# Altium footprint library MCUs.PcbLib: 22 footprints (part 1 of 2)
Each footprint in its own frame and in the unit in brackets; x right, y up, seen from the top. Pads: shape width x height; smd on the part's side, far side on the other; paste and mask are expansions set on the pad; w line width, h text height; cw(c..) or ccw(c..) is an arc to the next point about the centre after c.
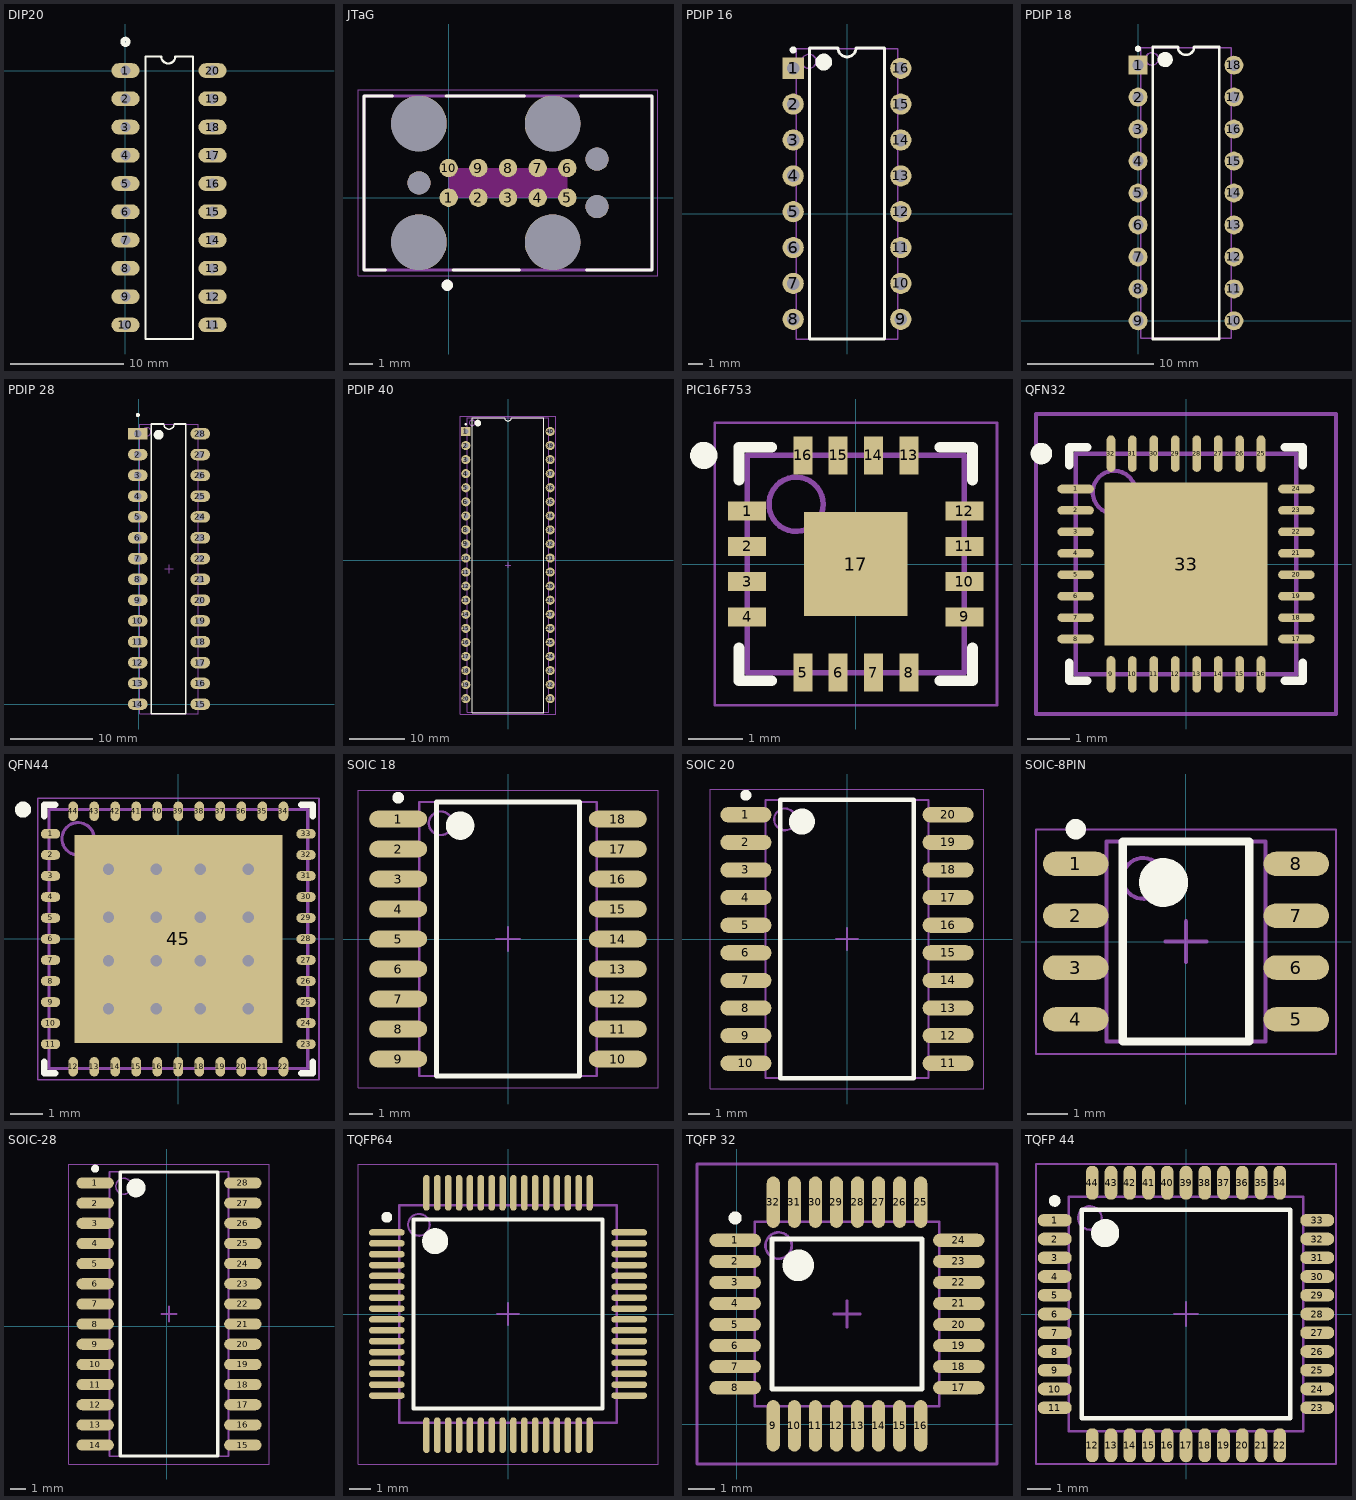
[diagram p0: the footprints below, top view; thin cyan lines are the x and y axes]

## DIP20 [mm] "PDIP 20"
pads (20):
  oval 2.5x1.3 hole 0.9: 1(0,0) 2(0,-2.5) 3(0,-5) 4(0,-7.5) 5(0,-10) 6(0,-12.5) 7(0,-15) 8(0,-17.5) 9(0,-20) 10(0,-22.5) 11(7.707,-22.5) 12(7.707,-20) 13(7.707,-17.5) 14(7.707,-15) 15(7.707,-12.5) 16(7.707,-10) 17(7.707,-7.5) 18(7.707,-5) 19(7.707,-2.5) 20(7.707,0)
Top Overlay:
  circle w0.4: c0,2.54 r0.25
  lines w0.2: 1.778,-23.75 1.778,1.25 3.165,1.25 ccw(c3.79,1.25) 4.415,1.25 5.969,1.25 5.969,-23.75 1.778,-23.75
3D body "User Library-DIP20.STEP": height 5.07, standoff -3.31, extent -0.1,-24.446 7.72,2.094

## JTaG [mil] "Connector Debugger"
pads (17):
  round 31 smd paste-39.37: 1(0,0) 2(50,0) 3(100,0) 4(150,0) 5(200,0) 6(200,50) 7(150,50) 8(100,50) 9(50,50) 10(0,50)
  round 93.5 hole 93.5 unplated: ""(-50,-75) ""(-50,125) ""(175,-75) ""(175,125)
  round 39 hole 39 unplated: ""(-50,25) ""(250,-14.96) ""(250,64.96)
Top Overlay:
  circle w9.45: c-2.36,-147.49 r4.72
  lines w5: -106.69,-121.77 -142.91,-121.77 -142.91,171.77 -94.88,171.77 ; -4.33,171.77 127.56,171.77 ; 7.48,-121.77 119.69,-121.77 ; 222.05,171.77 342.91,171.77 342.91,-121.77 231.89,-121.77
Keep-Out Layer:
  drawing of 18 lines, arcs and shapes, not listed
Mechanical 13:
  circle w9.45: c-2.16,-147.49 r4.72
  lines w5: -142.91,-121.77 342.91,-121.77 342.91,171.77 -142.91,171.77 -142.91,-121.77
Mechanical 15:
  lines w1.97: -152.76,-131.61 352.76,-131.61 352.76,181.61 -152.76,181.61 -152.76,-131.61

## PDIP 16 [mm] "PDIP 16 2.54mm Pitch"
pads (16):
  rect 1.5x1.5 hole 0.9: 1(-3.81,10.287)
  round 1.5 hole 0.9: 2(-3.81,7.747) 3(-3.81,5.207) 4(-3.81,2.667) 5(-3.81,0.127) 6(-3.81,-2.413) 7(-3.81,-4.953) 8(-3.81,-7.493) 9(3.81,-7.493) 10(3.81,-4.953) 11(3.81,-2.413) 12(3.81,0.127) 13(3.81,2.667) 14(3.81,5.207) 15(3.81,7.747) 16(3.81,10.287)
Top Overlay:
  circle w0.6: c-1.65,10.727 r0.3
  circle w0.25: c-3.81,11.587 r0.125
  lines w0.2: -2.65,-8.89 2.65,-8.89 2.65,11.727 0.635,11.727 cw(c0,11.727) -0.635,11.727 -2.65,11.727 -2.65,-8.89
Mechanical 13:
  circle w0.1: c-2.7,10.777 r0.5
  lines w0.1: -3.6,-8.89 3.6,-8.89 3.6,11.677 -3.6,11.677 -3.6,-8.89
3D body "DIP16.step": height 8.89, standoff 2.13, extent -4.064,-9.398 3.81,12.192
3D body "Socket IC 16P.step": height 5.5, standoff -2.5, extent -5.08,-8.763 5.08,11.557

## PDIP 18 [mm] "IC PDIP 18"
pads (18):
  rect 1.5x1.5 hole 0.9: 1(0,20.32)
  round 1.5 hole 0.9: 2(0,17.78) 3(0,15.24) 4(0,12.7) 5(0,10.16) 6(0,7.62) 7(0,5.08) 8(0,2.54) 9(0,0) 10(7.62,0) 11(7.62,2.54) 12(7.62,5.08) 13(7.62,7.62) 14(7.62,10.16) 15(7.62,12.7) 16(7.62,15.24) 17(7.62,17.78) 18(7.62,20.32)
Top Overlay:
  circle w0.6: c2.16,20.76 r0.3
  circle w0.25: c0,21.62 r0.125
  lines w0.2: 1.16,-1.44 6.46,-1.44 6.46,21.76 4.445,21.76 cw(c3.81,21.76) 3.175,21.76 1.16,21.76 1.16,-1.44
Mechanical 13:
  circle w0.1: c1.11,20.81 r0.5
  lines w0.1: 0.21,-1.39 7.41,-1.39 7.41,21.71 0.21,21.71 0.21,-1.39
3D body "DIP18-1.STEP": height 5.57, standoff -2.81, extent -0.227,-1.333 7.593,21.907

## PDIP 28 [mm] "PDIP 28 Through Hole"
pads (28):
  rect 2.4x1.4 hole 0.9: 1(-0.127,33.02)
  oval 2.4x1.4 hole 0.9: 2(-0.127,30.48) 3(-0.127,27.94) 4(-0.127,25.4) 5(-0.127,22.86) 6(-0.127,20.32) 7(-0.127,17.78) 8(-0.127,15.24) 9(-0.127,12.7) 10(-0.127,10.16) 11(-0.127,7.62) 12(-0.127,5.08) 13(-0.127,2.54) 14(-0.127,0) 15(7.493,0) 16(7.493,2.54) 17(7.493,5.08) 18(7.493,7.62) 19(7.493,10.16) 20(7.493,12.7) 21(7.493,15.24) 22(7.493,17.78) 23(7.493,20.32) 24(7.493,22.86) 25(7.493,25.4) 26(7.493,27.94) 27(7.493,30.48) 28(7.493,33.02)
Top Overlay:
  circle w0.6: c2.413,32.893 r0.3
  circle w0.25: c-0.127,35.306 r0.125
  lines w0.2: 1.524,-1.19 5.715,-1.19 5.715,34.21 4.318,34.21 cw(c3.683,34.21) 3.048,34.21 1.524,34.21 1.524,-1.19
Mechanical 13:
  circle w0.1: c0.983,33.26 r0.5
  lines w0.1: 0.083,-1.14 7.283,-1.14 7.283,34.16 0.083,34.16 0.083,-1.14
Mechanical 15:
  lines w0.1: 3.183,16.51 4.183,16.51 ; 3.683,16.01 3.683,17.01
3D body "IC SOCKET 28P.step": height 5.3, standoff -2.7, extent -1.397,-1.143 8.763,34.417
3D body "28PDIP.step": height 9.15, standoff 2.93, extent -0.254,-1.461 7.62,34.481

## PDIP 40 [mm] "PDIP 40 IC Socket"
pads (40):
  rect 1.65x1.65 hole 0.9: 1(-7.62,23.241)
  round 1.65 hole 0.9: 2(-7.62,20.701) 3(-7.62,18.161) 4(-7.62,15.621) 5(-7.62,13.081) 6(-7.62,10.541) 7(-7.62,8.001) 8(-7.62,5.461) 9(-7.62,2.921) 10(-7.62,0.381) 11(-7.62,-2.159) 12(-7.62,-4.699) 13(-7.62,-7.239) 14(-7.62,-9.779) 15(-7.62,-12.319) 16(-7.62,-14.859) 17(-7.62,-17.399) 18(-7.62,-19.939) 19(-7.62,-22.479) 20(-7.62,-25.019) 21(7.62,-25.019) 22(7.62,-22.479) 23(7.62,-19.939) 24(7.62,-17.399) 25(7.62,-14.859) 26(7.62,-12.319) 27(7.62,-9.779) 28(7.62,-7.239) 29(7.62,-4.699) 30(7.62,-2.159) 31(7.62,0.381) 32(7.62,2.921) 33(7.62,5.461) 34(7.62,8.001) 35(7.62,10.541) 36(7.62,13.081) 37(7.62,15.621) 38(7.62,18.161) 39(7.62,20.701) 40(7.62,23.241)
Top Overlay:
  circle w0.6: c-5.45,24.761 r0.3
  circle w0.25: c-7.62,24.541 r0.125
  lines w0.2: -6.45,-27.539 6.45,-27.539 6.45,25.761 0.635,25.761 cw(c0,25.761) -0.635,25.761 -6.45,25.761 -6.45,-27.539
Mechanical 13:
  circle w0.1: c-6.475,24.811 r0.5
  lines w0.1: -7.375,-27.489 7.375,-27.489 7.375,25.711 -7.375,25.711 -7.375,-27.489
Mechanical 15:
  lines w0.05: -8.65,-27.789 8.65,-27.789 8.65,26.011 -8.65,26.011 -8.65,-27.789
  lines w0.1: -0.5,-0.889 0.5,-0.889 ; 0,-1.389 0,-0.389
3D body "40 PDIP SOCKET.STEP": height 4.47, standoff -2.9, extent -8.85,-26.289 8.85,24.511
3D body: height 0, standoff -1.6, extent 7.485,22.881 7.755,23.601
3D body: height 3.51, standoff 3.23, extent 7.375,22.741 7.755,23.741
3D body: height 3.24, standoff 0, extent 7.485,22.741 7.755,23.741
3D body: height 0, standoff -1.6, extent 7.485,20.341 7.755,21.061
3D body: height 3.51, standoff 3.23, extent 7.375,20.201 7.755,21.201
3D body: height 3.24, standoff 0, extent 7.485,20.201 7.755,21.201
3D body: height 0, standoff -1.6, extent 7.485,17.801 7.755,18.521
3D body: height 3.51, standoff 3.23, extent 7.375,17.661 7.755,18.661
3D body: height 3.24, standoff 0, extent 7.485,17.661 7.755,18.661
3D body: height 0, standoff -1.6, extent 7.485,15.261 7.755,15.981
3D body: height 3.51, standoff 3.23, extent 7.375,15.121 7.755,16.121
3D body: height 3.24, standoff 0, extent 7.485,15.121 7.755,16.121
3D body: height 0, standoff -1.6, extent 7.485,12.721 7.755,13.441
3D body: height 3.51, standoff 3.23, extent 7.375,12.581 7.755,13.581
3D body: height 3.24, standoff 0, extent 7.485,12.581 7.755,13.581
3D body: height 0, standoff -1.6, extent 7.485,10.181 7.755,10.901
3D body: height 3.51, standoff 3.23, extent 7.375,10.041 7.755,11.041
3D body: height 3.24, standoff 0, extent 7.485,10.041 7.755,11.041
3D body: height 0, standoff -1.6, extent 7.485,7.641 7.755,8.361
3D body: height 3.51, standoff 3.23, extent 7.375,7.501 7.755,8.501
3D body: height 3.24, standoff 0, extent 7.485,7.501 7.755,8.501
3D body: height 0, standoff -1.6, extent 7.485,5.101 7.755,5.821
3D body: height 3.51, standoff 3.23, extent 7.375,4.961 7.755,5.961
3D body: height 3.24, standoff 0, extent 7.485,4.961 7.755,5.961
3D body: height 0, standoff -1.6, extent 7.485,2.561 7.755,3.281
3D body: height 3.51, standoff 3.23, extent 7.375,2.421 7.755,3.421
3D body: height 3.24, standoff 0, extent 7.485,2.421 7.755,3.421
3D body: height 0, standoff -1.6, extent 7.485,0.021 7.755,0.741
3D body: height 3.51, standoff 3.23, extent 7.375,-0.119 7.755,0.881
3D body: height 3.24, standoff 0, extent 7.485,-0.119 7.755,0.881
3D body: height 0, standoff -1.6, extent 7.485,-2.519 7.755,-1.799
3D body: height 3.51, standoff 3.23, extent 7.375,-2.659 7.755,-1.659
3D body: height 3.24, standoff 0, extent 7.485,-2.659 7.755,-1.659
3D body: height 0, standoff -1.6, extent 7.485,-5.059 7.755,-4.339
3D body: height 3.51, standoff 3.23, extent 7.375,-5.199 7.755,-4.199
3D body: height 3.24, standoff 0, extent 7.485,-5.199 7.755,-4.199
3D body: height 0, standoff -1.6, extent 7.485,-7.599 7.755,-6.879
3D body: height 3.51, standoff 3.23, extent 7.375,-7.739 7.755,-6.739
3D body: height 3.24, standoff 0, extent 7.485,-7.739 7.755,-6.739
3D body: height 0, standoff -1.6, extent 7.485,-10.139 7.755,-9.419
3D body: height 3.51, standoff 3.23, extent 7.375,-10.279 7.755,-9.279
3D body: height 3.24, standoff 0, extent 7.485,-10.279 7.755,-9.279
3D body: height 0, standoff -1.6, extent 7.485,-12.679 7.755,-11.959
3D body: height 3.51, standoff 3.23, extent 7.375,-12.819 7.755,-11.819
3D body: height 3.24, standoff 0, extent 7.485,-12.819 7.755,-11.819
3D body: height 0, standoff -1.6, extent 7.485,-15.219 7.755,-14.499
3D body: height 3.51, standoff 3.23, extent 7.375,-15.359 7.755,-14.359
3D body: height 3.24, standoff 0, extent 7.485,-15.359 7.755,-14.359
3D body: height 0, standoff -1.6, extent 7.485,-17.759 7.755,-17.039
3D body: height 3.51, standoff 3.23, extent 7.375,-17.899 7.755,-16.899
3D body: height 3.24, standoff 0, extent 7.485,-17.899 7.755,-16.899
3D body: height 0, standoff -1.6, extent 7.485,-20.299 7.755,-19.579
3D body: height 3.51, standoff 3.23, extent 7.375,-20.439 7.755,-19.439
3D body: height 3.24, standoff 0, extent 7.485,-20.439 7.755,-19.439
3D body: height 0, standoff -1.6, extent 7.485,-22.839 7.755,-22.119
3D body: height 3.51, standoff 3.23, extent 7.375,-22.979 7.755,-21.979
3D body: height 3.24, standoff 0, extent 7.485,-22.979 7.755,-21.979
3D body: height 0, standoff -1.6, extent 7.485,-25.379 7.755,-24.659
3D body: height 3.51, standoff 3.23, extent 7.375,-25.519 7.755,-24.519
3D body: height 3.24, standoff 0, extent 7.485,-25.519 7.755,-24.519
3D body: height 0, standoff -1.6, extent -7.755,-25.379 -7.485,-24.659
3D body: height 3.51, standoff 3.23, extent -7.755,-25.519 -7.375,-24.519
3D body: height 3.24, standoff 0, extent -7.755,-25.519 -7.485,-24.519
3D body: height 0, standoff -1.6, extent -7.755,-22.839 -7.485,-22.119
3D body: height 3.51, standoff 3.23, extent -7.755,-22.979 -7.375,-21.979
3D body: height 3.24, standoff 0, extent -7.755,-22.979 -7.485,-21.979
3D body: height 0, standoff -1.6, extent -7.755,-20.299 -7.485,-19.579
3D body: height 3.51, standoff 3.23, extent -7.755,-20.439 -7.375,-19.439
3D body: height 3.24, standoff 0, extent -7.755,-20.439 -7.485,-19.439
3D body: height 0, standoff -1.6, extent -7.755,-17.759 -7.485,-17.039
3D body: height 3.51, standoff 3.23, extent -7.755,-17.899 -7.375,-16.899
3D body: height 3.24, standoff 0, extent -7.755,-17.899 -7.485,-16.899
3D body: height 0, standoff -1.6, extent -7.755,-15.219 -7.485,-14.499
3D body: height 3.51, standoff 3.23, extent -7.755,-15.359 -7.375,-14.359
3D body: height 3.24, standoff 0, extent -7.755,-15.359 -7.485,-14.359
3D body: height 0, standoff -1.6, extent -7.755,-12.679 -7.485,-11.959
3D body: height 3.51, standoff 3.23, extent -7.755,-12.819 -7.375,-11.819
3D body: height 3.24, standoff 0, extent -7.755,-12.819 -7.485,-11.819
3D body: height 0, standoff -1.6, extent -7.755,-10.139 -7.485,-9.419
3D body: height 3.51, standoff 3.23, extent -7.755,-10.279 -7.375,-9.279
3D body: height 3.24, standoff 0, extent -7.755,-10.279 -7.485,-9.279
3D body: height 0, standoff -1.6, extent -7.755,-7.599 -7.485,-6.879
3D body: height 3.51, standoff 3.23, extent -7.755,-7.739 -7.375,-6.739
3D body: height 3.24, standoff 0, extent -7.755,-7.739 -7.485,-6.739
3D body: height 0, standoff -1.6, extent -7.755,-5.059 -7.485,-4.339
3D body: height 3.51, standoff 3.23, extent -7.755,-5.199 -7.375,-4.199
3D body: height 3.24, standoff 0, extent -7.755,-5.199 -7.485,-4.199
3D body: height 0, standoff -1.6, extent -7.755,-2.519 -7.485,-1.799
3D body: height 3.51, standoff 3.23, extent -7.755,-2.659 -7.375,-1.659
3D body: height 3.24, standoff 0, extent -7.755,-2.659 -7.485,-1.659
3D body: height 0, standoff -1.6, extent -7.755,0.021 -7.485,0.741
3D body: height 3.51, standoff 3.23, extent -7.755,-0.119 -7.375,0.881
3D body: height 3.24, standoff 0, extent -7.755,-0.119 -7.485,0.881
3D body: height 0, standoff -1.6, extent -7.755,2.561 -7.485,3.281
3D body: height 3.51, standoff 3.23, extent -7.755,2.421 -7.375,3.421
3D body: height 3.24, standoff 0, extent -7.755,2.421 -7.485,3.421
3D body: height 0, standoff -1.6, extent -7.755,5.101 -7.485,5.821
3D body: height 3.51, standoff 3.23, extent -7.755,4.961 -7.375,5.961
3D body: height 3.24, standoff 0, extent -7.755,4.961 -7.485,5.961
3D body: height 0, standoff -1.6, extent -7.755,7.641 -7.485,8.361
3D body: height 3.51, standoff 3.23, extent -7.755,7.501 -7.375,8.501
3D body: height 3.24, standoff 0, extent -7.755,7.501 -7.485,8.501
3D body: height 0, standoff -1.6, extent -7.755,10.181 -7.485,10.901
3D body: height 3.51, standoff 3.23, extent -7.755,10.041 -7.375,11.041
3D body: height 3.24, standoff 0, extent -7.755,10.041 -7.485,11.041
3D body: height 0, standoff -1.6, extent -7.755,12.721 -7.485,13.441
3D body: height 3.51, standoff 3.23, extent -7.755,12.581 -7.375,13.581
3D body: height 3.24, standoff 0, extent -7.755,12.581 -7.485,13.581
3D body: height 0, standoff -1.6, extent -7.755,15.261 -7.485,15.981
3D body: height 3.51, standoff 3.23, extent -7.755,15.121 -7.375,16.121
3D body: height 3.24, standoff 0, extent -7.755,15.121 -7.485,16.121
3D body: height 0, standoff -1.6, extent -7.755,17.801 -7.485,18.521
3D body: height 3.51, standoff 3.23, extent -7.755,17.661 -7.375,18.661
3D body: height 3.24, standoff 0, extent -7.755,17.661 -7.485,18.661
3D body: height 0, standoff -1.6, extent -7.755,20.341 -7.485,21.061
3D body: height 3.51, standoff 3.23, extent -7.755,20.201 -7.375,21.201
3D body: height 3.24, standoff 0, extent -7.755,20.201 -7.485,21.201
3D body: height 0, standoff -1.6, extent -7.755,22.881 -7.485,23.601
3D body: height 3.51, standoff 3.23, extent -7.755,22.741 -7.375,23.741
3D body: height 3.24, standoff 0, extent -7.755,22.741 -7.485,23.741
3D body "PDIP-40.step": height 8.96, standoff 1.6, extent -7.765,-27.051 7.765,25.209

## PIC16F753 [mm] "QFN 16P"
height 1
pads (17):
  rect 0.7x0.35 smd: 1(-2,0.975) 2(-2,0.325) 3(-2,-0.325) 4(-2,-0.975) 9(2,-0.975) 10(2,-0.325) 11(2,0.325) 12(2,0.975)
  rect 0.35x0.7 smd: 5(-0.975,-2) 6(-0.325,-2) 7(0.325,-2) 8(0.975,-2) 13(0.975,2) 14(0.325,2) 15(-0.325,2) 16(-0.975,2)
  rect 1.91x1.91 smd: 17(0,0)
Top Overlay:
  circle w0.25: c-2.8,2 r0.125
  lines w0.2: -2.15,-1.55 -2.15,-2.15 -1.55,-2.15 ; -2.15,1.55 -2.15,2.15 -1.55,2.15 ; 1.55,-2.15 2.15,-2.15 2.15,-1.55 ; 1.55,2.15 2.15,2.15 2.15,1.55
Mechanical 13:
  circle w0.1: c-1.1,1.1 r0.5
  lines w0.1: -2,-2 2,-2 2,2 -2,2 -2,-2
Mechanical 15:
  lines w0.05: -2.6,-2.6 2.6,-2.6 2.6,2.6 -2.6,2.6 -2.6,-2.6
  lines w0.1: -0.5,0 0.5,0 ; 0,-0.5 0,0.5
3D body: height 1, standoff 0.01, extent -2,-2 2,2

## QFN32 [mm] "QFN 32 5X5mm"
pads (33):
  oval 0.85x0.2 smd: 1(-2.575,1.75) 2(-2.575,1.25) 3(-2.575,0.75) 4(-2.575,0.25) 5(-2.575,-0.25) 6(-2.575,-0.75) 7(-2.575,-1.25) 8(-2.575,-1.75) 17(2.575,-1.75) 18(2.575,-1.25) 19(2.575,-0.75) 20(2.575,-0.25) 21(2.575,0.25) 22(2.575,0.75) 23(2.575,1.25) 24(2.575,1.75)
  oval 0.2x0.85 smd: 9(-1.75,-2.575) 10(-1.25,-2.575) 11(-0.75,-2.575) 12(-0.25,-2.575) 13(0.25,-2.575) 14(0.75,-2.575) 15(1.25,-2.575) 16(1.75,-2.575) 25(1.75,2.575) 26(1.25,2.575) 27(0.75,2.575) 28(0.25,2.575) 29(-0.25,2.575) 30(-0.75,2.575) 31(-1.25,2.575) 32(-1.75,2.575)
  rect 3.8x3.8 smd: 33(0,0)
Top Overlay:
  circle w0.25: c-3.375,2.575 r0.125
  lines w0.2: -2.725,-2.3 -2.725,-2.725 -2.3,-2.725 ; -2.725,2.3 -2.725,2.725 -2.3,2.725 ; 2.3,-2.725 2.725,-2.725 2.725,-2.3 ; 2.3,2.725 2.725,2.725 2.725,2.3
Mechanical 13:
  circle w0.1: c-1.675,1.675 r0.5
  lines w0.1: -2.575,-2.575 2.575,-2.575 2.575,2.575 -2.575,2.575 -2.575,-2.575
Mechanical 15:
  lines w0.1: -0.5,0 0.5,0 ; 0,-0.5 0,0.5 ; -3.5,-3.5 3.5,-3.5 3.5,3.5 -3.5,3.5 -3.5,-3.5
3D body "QFN-32UH.step": height 0.75, standoff 0, extent -2.51,-2.51 2.51,2.51

## QFN44 [mm] "QFN, 44-Leads, Body 8x8mm, Pitch 0.65mm, Thermal Pad 6.425x6.425mm, IPC High Density"
pads (45):
  oval 0.6x0.3 smd: 1(-3.95,3.25) 2(-3.95,2.6) 3(-3.95,1.95) 4(-3.95,1.3) 5(-3.95,0.65) 6(-3.95,0) 7(-3.95,-0.65) 8(-3.95,-1.3) 9(-3.95,-1.95) 10(-3.95,-2.6) 11(-3.95,-3.25) 23(3.95,-3.25) 24(3.95,-2.6) 25(3.95,-1.95) 26(3.95,-1.3) 27(3.95,-0.65) 28(3.95,0) 29(3.95,0.65) 30(3.95,1.3) 31(3.95,1.95) 32(3.95,2.6) 33(3.95,3.25)
  oval 0.3x0.6 smd: 12(-3.25,-3.95) 13(-2.6,-3.95) 14(-1.95,-3.95) 15(-1.3,-3.95) 16(-0.65,-3.95) 17(0,-3.95) 18(0.65,-3.95) 19(1.3,-3.95) 20(1.95,-3.95) 21(2.6,-3.95) 22(3.25,-3.95) 34(3.25,3.95) 35(2.6,3.95) 36(1.95,3.95) 37(1.3,3.95) 38(0.65,3.95) 39(0,3.95) 40(-0.65,3.95) 41(-1.3,3.95) 42(-1.95,3.95) 43(-2.6,3.95) 44(-3.25,3.95)
  rect 6.43x6.43 smd: 45(0,0)
via -2.158,2.158 diameter 0.5 hole 0.35
via -0.677,2.158 diameter 0.5 hole 0.35
via 0.677,2.158 diameter 0.5 hole 0.35
via 2.158,2.158 diameter 0.5 hole 0.35
via -2.158,0.677 diameter 0.5 hole 0.35
via -0.677,0.677 diameter 0.5 hole 0.35
via 0.677,0.677 diameter 0.5 hole 0.35
via 2.158,0.677 diameter 0.5 hole 0.35
via -2.158,-0.677 diameter 0.5 hole 0.35
via -0.677,-0.677 diameter 0.5 hole 0.35
via 0.677,-0.677 diameter 0.5 hole 0.35
via 2.158,-0.677 diameter 0.5 hole 0.35
via -2.158,-2.158 diameter 0.5 hole 0.35
via -0.677,-2.158 diameter 0.5 hole 0.35
via 0.677,-2.158 diameter 0.5 hole 0.35
via 2.158,-2.158 diameter 0.5 hole 0.35
Top Overlay:
  circle w0.25: c-4.8,4 r0.125
  lines w0.2: -4.15,-3.8 -4.15,-4.15 -3.8,-4.15 ; -4.15,3.8 -4.15,4.15 -3.8,4.15 ; 3.8,-4.15 4.15,-4.15 4.15,-3.8 ; 3.8,4.15 4.15,4.15 4.15,3.8
Mechanical 13:
  circle w0.1: c-3.1,3.1 r0.5
  lines w0.1: -4,-4 -4,4 4,4 4,-4 -4,-4
Mechanical 15:
  lines w0.05: -4.35,-4.35 -4.35,4.35 4.35,4.35 4.35,-4.35 -4.35,-4.35
  lines w0.1: -0.5,0 0.5,0 ; 0,-0.5 0,0.5
3D body "QFN44_8x8.step": height 0.88, standoff -0.02, extent -4.01,-4.01 4.01,4.01

## SOIC 18 [mm] "SOIC IC 18p"
height 2.65
pads (18):
  oval 2.45x0.7 smd: 1(-4.65,5.08) 2(-4.65,3.81) 3(-4.65,2.54) 4(-4.65,1.27) 5(-4.65,0) 6(-4.65,-1.27) 7(-4.65,-2.54) 8(-4.65,-3.81) 9(-4.65,-5.08) 10(4.65,-5.08) 11(4.65,-3.81) 12(4.65,-2.54) 13(4.65,-1.27) 14(4.65,0) 15(4.65,1.27) 16(4.65,2.54) 17(4.65,3.81) 18(4.65,5.08)
Top Overlay:
  circle w0.25: c-4.65,5.98 r0.125
  circle w0.6: c-2.025,4.8 r0.3
  lines w0.2: -3.025,-5.8 -3.025,5.8 3.025,5.8 3.025,-5.8 -3.025,-5.8
Mechanical 13:
  circle w0.1: c-2.85,4.9 r0.5
  lines w0.1: -3.75,-5.8 -3.75,5.8 3.75,5.8 3.75,-5.8 -3.75,-5.8
Mechanical 15:
  lines w0.05: -6.35,-6.3 -6.35,6.3 6.35,6.3 6.35,-6.3 -6.35,-6.3
  lines w0.1: -0.5,0 0.5,0 ; 0,-0.5 0,0.5
3D body "SOIC18-300.step": height 2.65, standoff 0, extent -5.15,-5.765 5.15,5.765

## SOIC 20 [mm] "SOIC SMD 20"
height 2.65
pads (20):
  oval 2.35x0.7 smd: 1(-4.65,5.715) 2(-4.65,4.445) 3(-4.65,3.175) 4(-4.65,1.905) 5(-4.65,0.635) 6(-4.65,-0.635) 7(-4.65,-1.905) 8(-4.65,-3.175) 9(-4.65,-4.445) 10(-4.65,-5.715) 11(4.65,-5.715) 12(4.65,-4.445) 13(4.65,-3.175) 14(4.65,-1.905) 15(4.65,-0.635) 16(4.65,0.635) 17(4.65,1.905) 18(4.65,3.175) 19(4.65,4.445) 20(4.65,5.715)
Top Overlay:
  circle w0.6: c-2.075,5.4 r0.3
  circle w0.25: c-4.65,6.615 r0.125
  lines w0.2: -3.075,-6.4 3.075,-6.4 3.075,6.4 -3.075,6.4 -3.075,-6.4
Mechanical 13:
  circle w0.1: c-2.85,5.5 r0.5
  lines w0.1: -3.75,-6.4 3.75,-6.4 3.75,6.4 -3.75,6.4 -3.75,-6.4
Mechanical 15:
  lines w0.05: -6.3,-6.9 6.3,-6.9 6.3,6.9 -6.3,6.9 -6.3,-6.9
  lines w0.1: -0.5,0 0.5,0 ; 0,-0.5 0,0.5
3D body "SOIC_20-300.STEP": height 2.6, standoff 0, extent -5.207,-6.3 5.193,6.3

## SOIC-8PIN [mm] "SOIC-8 PIN GEN"
pads (8):
  oval 1.6x0.6 smd: 1(-2.7,1.905) 2(-2.7,0.635) 3(-2.7,-0.635) 4(-2.7,-1.905) 5(2.7,-1.905) 6(2.7,-0.635) 7(2.7,0.635) 8(2.7,1.905)
Top Overlay:
  circle w0.25: c-2.7,2.755 r0.125
  circle w0.6: c-0.55,1.45 r0.3
  lines w0.2: -1.55,-2.45 -1.55,2.45 1.55,2.45 1.55,-2.45 -1.55,-2.45
Mechanical 13:
  circle w0.1: c-1.05,1.55 r0.5
  lines w0.1: -1.95,-2.45 -1.95,2.45 1.95,2.45 1.95,-2.45 -1.95,-2.45
Mechanical 15:
  lines w0.05: -3.675,-2.75 -3.675,2.75 3.675,2.75 3.675,-2.75 -3.675,-2.75
  lines w0.1: -0.5,0 0.5,0 ; 0,-0.5 0,0.5
3D body "SOIC-8PIN.step": height 1.25, standoff 0, extent -3.025,-2.45 3.025,2.45

## SOIC-28 [mm] "SOIC IC 28 PIN"
pads (28):
  oval 2.35x0.7 smd: 1(-4.523,9.017) 2(-4.523,7.747) 3(-4.523,6.477) 4(-4.523,5.207) 5(-4.523,3.937) 6(-4.523,2.667) 7(-4.523,1.397) 8(-4.523,0.127) 9(-4.523,-1.143) 10(-4.523,-2.413) 11(-4.523,-3.683) 12(-4.523,-4.953) 13(-4.523,-6.223) 14(-4.523,-7.493) 15(4.777,-7.493) 16(4.777,-6.223) 17(4.777,-4.953) 18(4.777,-3.683) 19(4.777,-2.413) 20(4.777,-1.143) 21(4.777,0.127) 22(4.777,1.397) 23(4.777,2.667) 24(4.777,3.937) 25(4.777,5.207) 26(4.777,6.477) 27(4.777,7.747) 28(4.777,9.017)
Top Overlay:
  circle w0.6: c-1.948,8.712 r0.3
  circle w0.25: c-4.523,9.917 r0.125
  lines w0.2: -2.948,-8.188 3.202,-8.188 3.202,9.712 -2.948,9.712 -2.948,-8.188
Mechanical 13:
  circle w0.1: c-2.723,8.812 r0.5
  lines w0.1: -3.623,-8.188 3.877,-8.188 3.877,9.712 -3.623,9.712 -3.623,-8.188
Mechanical 15:
  lines w0.05: -6.173,-8.688 6.427,-8.688 6.427,10.212 -6.173,10.212 -6.173,-8.688
  lines w0.1: -0.373,0.762 0.627,0.762 ; 0.127,0.262 0.127,1.262
3D body "28-SOIC.step": height 2.83, standoff 0.07, extent -5.023,-8.128 5.277,9.772

## TQFP64 [mm] "TQFP, 64-Leads, Body 10x10mm, Pitch 0.5mm, IPC Low Density"
height 1.2
pads (64):
  oval 1.65x0.3 smd: 1(-5.575,3.75) 2(-5.575,3.25) 3(-5.575,2.75) 4(-5.575,2.25) 5(-5.575,1.75) 6(-5.575,1.25) 7(-5.575,0.75) 8(-5.575,0.25) 9(-5.575,-0.25) 10(-5.575,-0.75) 11(-5.575,-1.25) 12(-5.575,-1.75) 13(-5.575,-2.25) 14(-5.575,-2.75) 15(-5.575,-3.25) 16(-5.575,-3.75) 33(5.575,-3.75) 34(5.575,-3.25) 35(5.575,-2.75) 36(5.575,-2.25) 37(5.575,-1.75) 38(5.575,-1.25) 39(5.575,-0.75) 40(5.575,-0.25) 41(5.575,0.25) 42(5.575,0.75) 43(5.575,1.25) 44(5.575,1.75) 45(5.575,2.25) 46(5.575,2.75) 47(5.575,3.25) 48(5.575,3.75)
  oval 0.3x1.65 smd: 17(-3.75,-5.575) 18(-3.25,-5.575) 19(-2.75,-5.575) 20(-2.25,-5.575) 21(-1.75,-5.575) 22(-1.25,-5.575) 23(-0.75,-5.575) 24(-0.25,-5.575) 25(0.25,-5.575) 26(0.75,-5.575) 27(1.25,-5.575) 28(1.75,-5.575) 29(2.25,-5.575) 30(2.75,-5.575) 31(3.25,-5.575) 32(3.75,-5.575) 49(3.75,5.575) 50(3.25,5.575) 51(2.75,5.575) 52(2.25,5.575) 53(1.75,5.575) 54(1.25,5.575) 55(0.75,5.575) 56(0.25,5.575) 57(-0.25,5.575) 58(-0.75,5.575) 59(-1.25,5.575) 60(-1.75,5.575) 61(-2.25,5.575) 62(-2.75,5.575) 63(-3.25,5.575) 64(-3.75,5.575)
Top Overlay:
  circle w0.6: c-3.35,3.35 r0.3
  circle w0.25: c-5.575,4.45 r0.125
  lines w0.2: -4.35,-4.35 4.35,-4.35 4.35,4.35 -4.35,4.35 -4.35,-4.35
Mechanical 13:
  circle w0.1: c-4.1,4.1 r0.5
  lines w0.1: -5,-5 5,-5 5,5 -5,5 -5,-5
Mechanical 15:
  lines w0.05: -6.9,-6.9 6.9,-6.9 6.9,6.9 -6.9,6.9 -6.9,-6.9
  lines w0.1: -0.5,0 0.5,0 ; 0,-0.5 0,0.5
3D body "TQFP64_Grid_0_5.STEP": height 1.2, standoff 0, extent -6,-6 6,6

## TQFP 32 [mm] "TQFP 32"
pads (32):
  oval 1.95x0.5 smd: 1(-0.059,6.991) 2(-0.059,6.191) 3(-0.059,5.391) 4(-0.059,4.591) 5(-0.059,3.791) 6(-0.059,2.991) 7(-0.059,2.191) 8(-0.059,1.391) 17(8.441,1.391) 18(8.441,2.191) 19(8.441,2.991) 20(8.441,3.791) 21(8.441,4.591) 22(8.441,5.391) 23(8.441,6.191) 24(8.441,6.991)
  oval 0.5x1.95 smd: 9(1.391,-0.059) 10(2.191,-0.059) 11(2.991,-0.059) 12(3.791,-0.059) 13(4.591,-0.059) 14(5.391,-0.059) 15(6.191,-0.059) 16(6.991,-0.059) 25(6.991,8.441) 26(6.191,8.441) 27(5.391,8.441) 28(4.591,8.441) 29(3.791,8.441) 30(2.991,8.441) 31(2.191,8.441) 32(1.391,8.441)
Top Overlay:
  circle w0.25: c-0.059,7.841 r0.125
  circle w0.6: c2.341,6.041 r0.3
  lines w0.2: 1.341,1.341 1.341,7.041 7.041,7.041 7.041,1.341 1.341,1.341
Mechanical 13:
  circle w0.1: c1.591,6.791 r0.5
  lines w0.1: 0.691,0.691 0.691,7.691 7.691,7.691 7.691,0.691 0.691,0.691
Mechanical 15:
  lines w0.1: 3.691,4.191 4.691,4.191 ; 4.191,3.691 4.191,4.691 ; -1.509,-1.509 -1.509,9.891 9.891,9.891 9.891,-1.509 -1.509,-1.509
3D body "atmega8.step": height 1.1, standoff -0.01, extent -0.552,-0.666 9.048,8.934

## TQFP 44 [mm] "44 TQFP"
pads (44):
  oval 1.45x0.55 smd: 1(-5.6,4) 2(-5.6,3.2) 3(-5.6,2.4) 4(-5.6,1.6) 5(-5.6,0.8) 6(-5.6,0) 7(-5.6,-0.8) 8(-5.6,-1.6) 9(-5.6,-2.4) 10(-5.6,-3.2) 11(-5.6,-4) 23(5.6,-4) 24(5.6,-3.2) 25(5.6,-2.4) 26(5.6,-1.6) 27(5.6,-0.8) 28(5.6,0) 29(5.6,0.8) 30(5.6,1.6) 31(5.6,2.4) 32(5.6,3.2) 33(5.6,4)
  oval 0.55x1.45 smd: 12(-4,-5.6) 13(-3.2,-5.6) 14(-2.4,-5.6) 15(-1.6,-5.6) 16(-0.8,-5.6) 17(0,-5.6) 18(0.8,-5.6) 19(1.6,-5.6) 20(2.4,-5.6) 21(3.2,-5.6) 22(4,-5.6) 34(4,5.6) 35(3.2,5.6) 36(2.4,5.6) 37(1.6,5.6) 38(0.8,5.6) 39(0,5.6) 40(-0.8,5.6) 41(-1.6,5.6) 42(-2.4,5.6) 43(-3.2,5.6) 44(-4,5.6)
Top Overlay:
  circle w0.6: c-3.45,3.45 r0.3
  circle w0.25: c-5.6,4.825 r0.125
  lines w0.2: -4.45,-4.45 4.45,-4.45 4.45,4.45 -4.45,4.45 -4.45,-4.45
Mechanical 13:
  circle w0.1: c-4.1,4.1 r0.5
  lines w0.1: -5,-5 5,-5 5,5 -5,5 -5,-5
Mechanical 15:
  lines w0.1: -0.5,0 0.5,0 ; 0,-0.5 0,0.5 ; -6.4,-6.4 6.4,-6.4 6.4,6.4 -6.4,6.4 -6.4,-6.4
3D body "44 pin tqfp ic package.step": height 1.1, standoff -0.01, extent -6,-6 6,6